# Altium footprint library SparkFun-Connectors.PCBLIB: 409 footprints (part 8 of 26)
Each footprint in its own frame and in the unit in brackets; x right, y up, seen from the top. Pads: shape width x height; smd on the part's side, far side on the other; paste and mask are expansions set on the pad; w line width, h text height; cw(c..) or ccw(c..) is an arc to the next point about the centre after c.
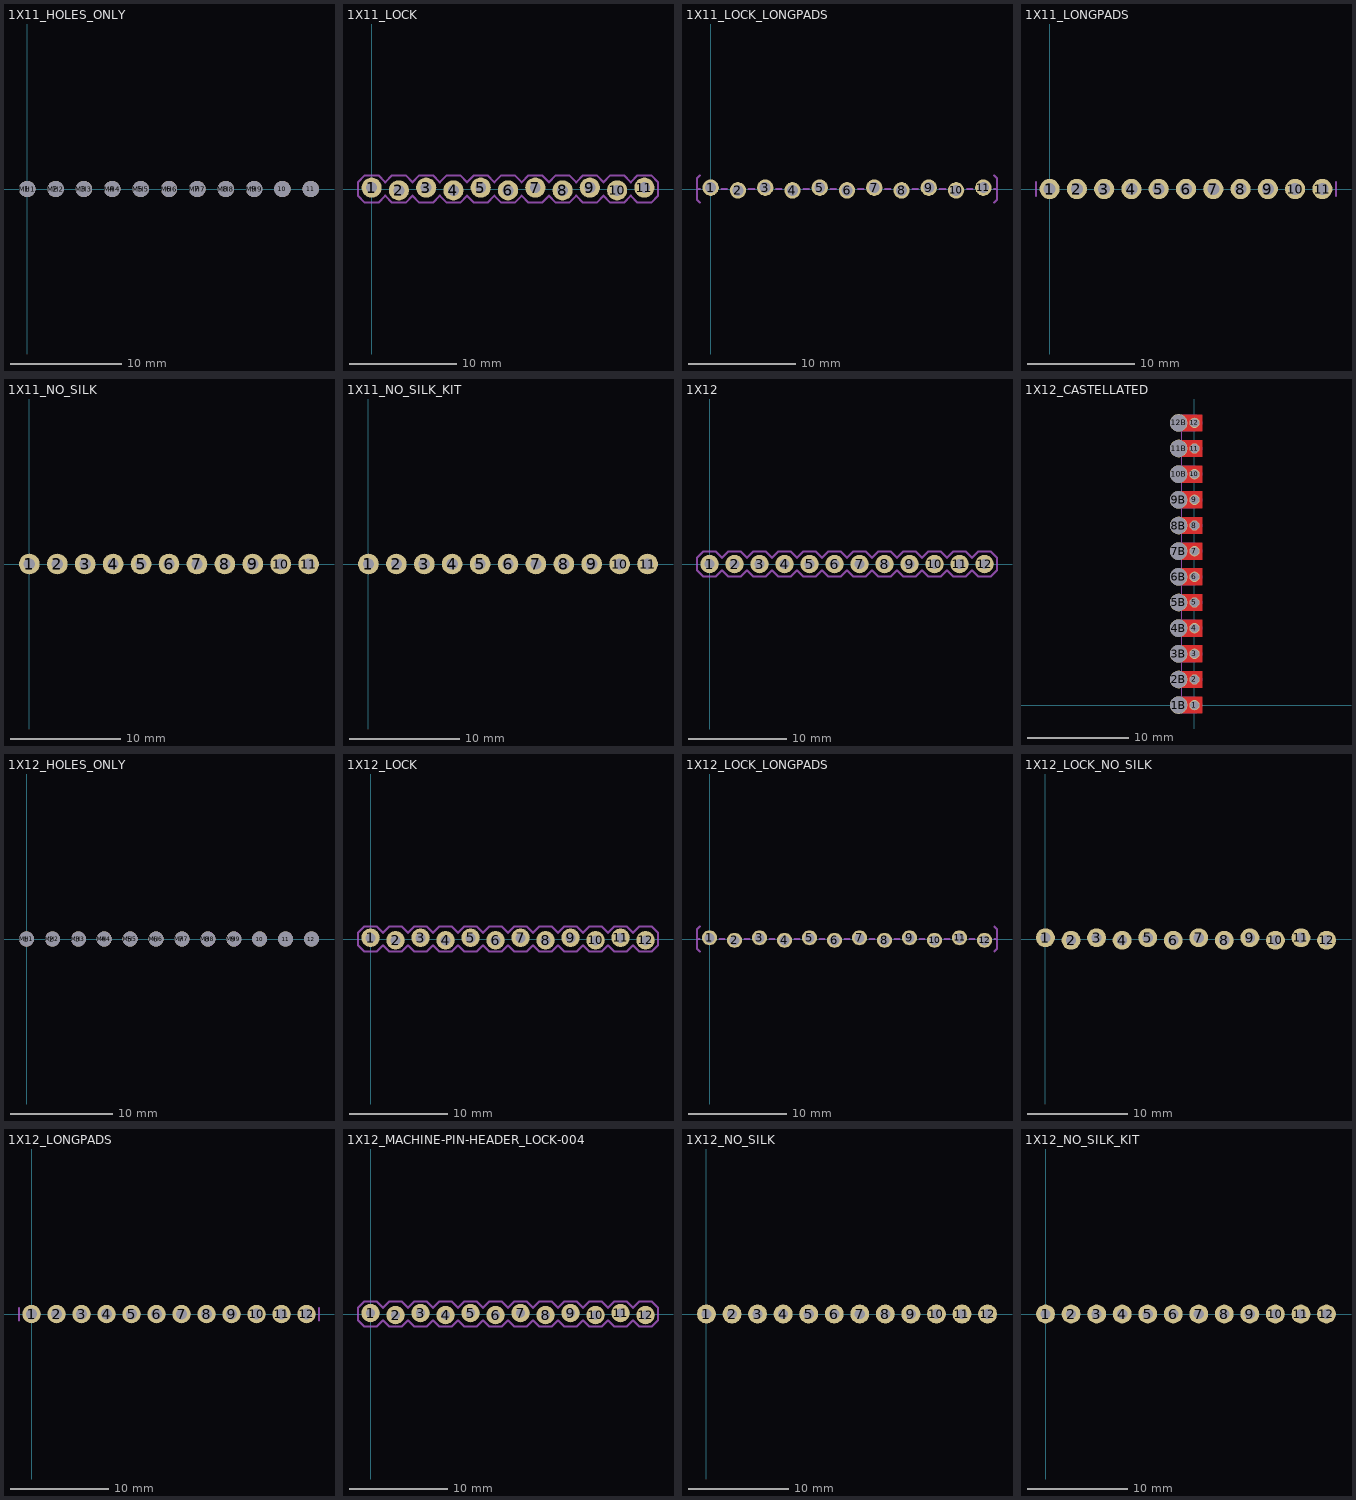
[diagram p7: the footprints below, top view; thin cyan lines are the x and y axes]

## 1X11_HOLES_ONLY [mil]
pads (22):
  round 35 hole 35: 1(0,0) 2(100,0) 3(200,0) 4(300,0) 5(400,0) 6(500,0) 7(600,0) 8(700,0) 9(800,0) 10(900,0) 11(1000,0)
  round 58 hole 58 unplated: MH1(0,0) MH2(100,0) MH3(200,0) MH4(300,0) MH5(400,0) MH6(500,0) MH7(600,0) MH8(700,0) MH9(800,0) MH10(900,0) MH11(1000,0)
tDocu:
  circle w5: c0,0 r25
  circle w5: c100,0 r25
  circle w5: c200,0 r25
  circle w5: c300,0 r25
  circle w5: c400,0 r25
  circle w5: c500,0 r25
  circle w5: c600,0 r25
  circle w5: c700,0 r25
  circle w5: c800,0 r25
  circle w5: c900,0 r25
  circle w5: c1000,0 r25

## 1X11_LOCK [mil]
pads (11):
  round 74 hole 40: 1(0,5) 2(100,-5) 3(200,5) 4(300,-5) 5(400,5) 6(500,-5) 7(600,5) 8(700,-5) 9(800,5) 10(900,-5) 11(1000,5)
tDocu:
  region: 590,-10 590,10 610,10 610,-10
  region: 490,-10 490,10 510,10 510,-10
  region: 390,-10 390,10 410,10 410,-10
  region: 290,-10 290,10 310,10 310,-10
  region: 190,-10 190,10 210,10 210,-10
  region: 90,-10 90,10 110,10 110,-10
  region: -10,-10 -10,10 10,10 10,-10
  region: 690,-10 690,10 710,10 710,-10
  region: 790,-10 790,10 810,10 810,-10
  region: 890,-10 890,10 910,10 910,-10
  region: 990,-10 990,10 1010,10 1010,-10
tPlace:
  lines w8: -50,-25 -50,25 -25,50 25,50 50,25 75,50 125,50 150,25 175,50 225,50 250,25 275,50 325,50 350,25 375,50 425,50 450,25 475,50 525,50 550,25 575,50 625,50 650,25 675,50 725,50 750,25 775,50 825,50 850,25 875,50 925,50 950,25 975,50 1025,50 1050,25 1050,-25 1025,-50 975,-50 950,-25 925,-50 875,-50 850,-25 825,-50 775,-50 750,-25 725,-50 675,-50 650,-25 625,-50 575,-50 550,-25 525,-50 475,-50 450,-25 425,-50 375,-50 350,-25 325,-50 275,-50 250,-25 225,-50 175,-50 150,-25 125,-50 75,-50 50,-25 25,-50 -25,-50 -50,-25

## 1X11_LOCK_LONGPADS [mil]
pads (11):
  round 60 hole 40: 1(0,5) 2(100,-5) 3(200,5) 4(300,-5) 5(400,5) 6(500,-5) 7(600,5) 8(700,-5) 9(800,5) 10(900,-5) 11(1000,5)
tDocu:
  region: -11.5,-11.5 -11.5,11.5 11.5,11.5 11.5,-11.5
  region: 88.5,-11.5 88.5,11.5 111.5,11.5 111.5,-11.5
  region: 188.5,-11.5 188.5,11.5 211.5,11.5 211.5,-11.5
  region: 311.5,-11.5 288.5,-11.5 288.5,11.5 311.5,11.5
  region: 388.5,-11.5 388.5,11.5 411.5,11.5 411.5,-11.5
  region: 488.5,-11.5 488.5,11.5 511.5,11.5 511.5,-11.5
  region: 588.5,-11.5 588.5,11.5 611.5,11.5 611.5,-11.5
  region: 688.5,-11.5 688.5,11.5 711.5,11.5 711.5,-11.5
  region: 788.5,-11.5 788.5,11.5 811.5,11.5 811.5,-11.5
  region: 911.5,-11.5 888.5,-11.5 888.5,11.5 911.5,11.5
  region: 988.5,-11.5 988.5,11.5 1011.5,11.5 1011.5,-11.5
tPlace:
  lines w8: -40,0 -50,0 ; -39,-50 -50,-39 -50,0 ; -39,50 -50,39 -50,0 ; 40,0 60,0 ; 140,0 160,0 ; 240,0 260,0 ; 340,0 360,0 ; 440,0 460,0 ; 540,0 560,0 ; 640,0 660,0 ; 740,0 760,0 ; 840,0 860,0 ; 940,0 960,0 ; 1039,-50 1050,-39 1050,0 ; 1039,50 1050,39 1050,0 ; 1040,0 1050,0

## 1X11_LONGPADS [mil]
pads (11):
  round 74 hole 44: 1(0,0) 2(100,0) 3(200,0) 4(300,0) 5(400,0) 6(500,0) 7(600,0) 8(700,0) 9(800,0) 10(900,0) 11(1000,0)
tDocu:
  region: 590,-10 590,10 610,10 610,-10
  region: 490,-10 490,10 510,10 510,-10
  region: 390,-10 390,10 410,10 410,-10
  region: 290,-10 290,10 310,10 310,-10
  region: 190,-10 190,10 210,10 210,-10
  region: 90,-10 90,10 110,10 110,-10
  region: -10,-10 -10,10 10,10 10,-10
  region: 690,-10 690,10 710,10 710,-10
  region: 790,-10 790,10 810,10 810,-10
  region: 890,-10 890,10 910,10 910,-10
  region: 990,-10 990,10 1010,10 1010,-10
tPlace:
  lines w8: -50,-25 -50,25 ; 1050,-25 1050,25

## 1X11_NO_SILK [mil]
pads (11):
  round 74 hole 40: 1(0,0) 2(100,0) 3(200,0) 4(300,0) 5(400,0) 6(500,0) 7(600,0) 8(700,0) 9(800,0) 10(900,0) 11(1000,0)
tDocu:
  region: 590,-10 590,10 610,10 610,-10
  region: 490,-10 490,10 510,10 510,-10
  region: 390,-10 390,10 410,10 410,-10
  region: 290,-10 290,10 310,10 310,-10
  region: 190,-10 190,10 210,10 210,-10
  region: 90,-10 90,10 110,10 110,-10
  region: -10,-10 -10,10 10,10 10,-10
  region: 690,-10 690,10 710,10 710,-10
  region: 790,-10 790,10 810,10 810,-10
  region: 890,-10 890,10 910,10 910,-10
  region: 990,-10 990,10 1010,10 1010,-10

## 1X11_NO_SILK_KIT [mil]
pads (11):
  round 74 hole 40: 1(0,0) 2(100,0) 3(200,0) 4(300,0) 5(400,0) 6(500,0) 7(600,0) 8(700,0) 9(800,0) 10(900,0) 11(1000,0)
Top Solder:
  circle w0: c0,0 r20
  circle w0: c100,0 r20
  circle w0: c200,0 r20
  circle w0: c300,0 r20
  circle w0: c400,0 r20
  circle w0: c500,0 r20
  circle w0: c600,0 r20
  circle w0: c700,0 r20
  circle w0: c800,0 r20
  circle w0: c900,0 r20
  circle w0: c1000,0 r20
Bottom Solder:
  circle w0: c0,0 r37.5
  circle w0: c100,0 r37.5
  circle w0: c200,0 r37.5
  circle w0: c300,0 r37.5
  circle w0: c400,0 r37.5
  circle w0: c500,0 r37.5
  circle w0: c600,0 r37.5
  circle w0: c700,0 r37.5
  circle w0: c800,0 r37.5
  circle w0: c900,0 r37.5
  circle w0: c1000,0 r37.5

## 1X12 [mil]
pads (12):
  round 74 hole 40: 1(0,0) 2(100,0) 3(200,0) 4(300,0) 5(400,0) 6(500,0) 7(600,0) 8(700,0) 9(800,0) 10(900,0) 11(1000,0) 12(1100,0)
tDocu:
  region: 590,-10 590,10 610,10 610,-10
  region: 490,-10 490,10 510,10 510,-10
  region: 390,-10 390,10 410,10 410,-10
  region: 290,-10 290,10 310,10 310,-10
  region: 190,-10 190,10 210,10 210,-10
  region: 90,-10 90,10 110,10 110,-10
  region: -10,-10 -10,10 10,10 10,-10
  region: 690,-10 690,10 710,10 710,-10
  region: 790,-10 790,10 810,10 810,-10
  region: 890,-10 890,10 910,10 910,-10
  region: 990,-10 990,10 1010,10 1010,-10
  region: 1090,-10 1090,10 1110,10 1110,-10
tPlace:
  lines w8: -50,-25 -50,25 -25,50 25,50 50,25 75,50 125,50 150,25 175,50 225,50 250,25 275,50 325,50 350,25 375,50 425,50 450,25 475,50 525,50 550,25 575,50 625,50 650,25 675,50 725,50 750,25 775,50 825,50 850,25 875,50 925,50 950,25 975,50 1025,50 1050,25 1075,50 1125,50 1150,25 1150,-25 1125,-50 1075,-50 1050,-25 1025,-50 975,-50 950,-25 925,-50 875,-50 850,-25 825,-50 775,-50 750,-25 725,-50 675,-50 650,-25 625,-50 575,-50 550,-25 525,-50 475,-50 450,-25 425,-50 375,-50 350,-25 325,-50 275,-50 250,-25 225,-50 175,-50 150,-25 125,-50 75,-50 50,-25 25,-50 -25,-50 -50,-25

## 1X12_CASTELLATED [mil]
pads (24):
  round 40 hole 33.46: 1(0,0) 2(0,100) 3(0,200) 4(0,300) 5(0,400) 6(0,500) 7(0,600) 8(0,700) 9(0,800) 10(0,900) 11(0,1000) 12(0,1100)
  round 68.9 hole 66.93: 1B(-61.81,0) 2B(-61.81,100) 3B(-61.81,200) 4B(-61.81,300) 5B(-61.81,400) 6B(-61.81,500) 7B(-61.81,600) 8B(-61.81,700) 9B(-61.81,800) 10B(-61.81,900) 11B(-61.81,1000) 12B(-61.81,1100)
Top:
  region: -50,632.5 30,632.5 30,600 30,567.5 -50,567.5
  region: -50,732.5 30,732.5 30,700 30,667.5 -50,667.5
  region: -50,532.5 30,532.5 30,500 30,467.5 -50,467.5
  region: -50,932.5 30,932.5 30,900 30,867.5 -50,867.5
  region: -50,1032.5 30,1032.5 30,1000 30,967.5 -50,967.5
  region: -50,832.5 30,832.5 30,800 30,767.5 -50,767.5
  region: -50,1132.5 30,1132.5 30,1100 30,1067.5 -50,1067.5
  region: -50,432.5 30,432.5 30,400 30,367.5 -50,367.5
  region: -50,232.5 30,232.5 30,200 30,167.5 -50,167.5
  region: -50,332.5 30,332.5 30,300 30,267.5 -50,267.5
  region: -50,132.5 30,132.5 30,100 30,67.5 -50,67.5
  region: -50,32.5 30,32.5 30,0 30,-32.5 -50,-32.5
Bottom:
  region: -50,567.5 0,567.5 3.05,567.7 8.98,569.24 14.5,571.87 19.42,575.5 23.58,580 26.8,585.2 28.98,590.91 30.05,596.94 30,600 29.96,603.04 28.79,609 26.54,614.64 23.31,619.78 19.19,624.25 14.32,627.88 8.87,630.57 3.02,632.22 0,632.5 -50,632.5
  region: -50,667.5 0,667.5 3.05,667.7 8.98,669.24 14.5,671.87 19.42,675.5 23.58,680 26.8,685.2 28.98,690.91 30.05,696.94 30,700 29.96,703.04 28.79,709 26.54,714.64 23.31,719.78 19.19,724.25 14.32,727.88 8.87,730.57 3.02,732.22 0,732.5 -50,732.5
  region: -50,467.5 0,467.5 3.05,467.7 8.98,469.24 14.5,471.87 19.42,475.5 23.58,480 26.8,485.2 28.98,490.91 30.05,496.94 30,500 29.96,503.04 28.79,509 26.54,514.64 23.31,519.78 19.19,524.25 14.32,527.88 8.87,530.57 3.02,532.22 0,532.5 -50,532.5
  region: -50,867.5 0,867.5 3.05,867.7 8.98,869.24 14.5,871.87 19.42,875.5 23.58,880 26.8,885.2 28.98,890.91 30.05,896.94 30,900 29.96,903.04 28.79,909 26.54,914.64 23.31,919.78 19.19,924.25 14.32,927.88 8.87,930.57 3.02,932.22 0,932.5 -50,932.5
  region: -50,967.5 0,967.5 3.05,967.7 8.98,969.24 14.5,971.87 19.42,975.5 23.58,980 26.8,985.2 28.98,990.91 30.05,996.94 30,1000 29.96,1003.04 28.79,1009 26.54,1014.64 23.31,1019.78 19.19,1024.25 14.32,1027.88 8.87,1030.57 3.02,1032.22 0,1032.5 -50,1032.5
  region: -50,767.5 0,767.5 3.05,767.7 8.98,769.24 14.5,771.87 19.42,775.5 23.58,780 26.8,785.2 28.98,790.91 30.05,796.94 30,800 29.96,803.04 28.79,809 26.54,814.64 23.31,819.78 19.19,824.25 14.32,827.88 8.87,830.57 3.02,832.22 0,832.5 -50,832.5
  region: -50,1067.5 0,1067.5 3.05,1067.7 8.98,1069.24 14.5,1071.87 19.42,1075.5 23.58,1080 26.8,1085.2 28.98,1090.91 30.05,1096.94 30,1100 29.96,1103.04 28.79,1109 26.54,1114.64 23.31,1119.78 19.19,1124.25 14.32,1127.88 8.87,1130.57 3.02,1132.22 0,1132.5 -50,1132.5
  region: -50,367.5 0,367.5 3.05,367.7 8.98,369.24 14.5,371.87 19.42,375.5 23.58,380 26.8,385.2 28.98,390.91 30.05,396.94 30,400 29.96,403.04 28.79,409 26.54,414.64 23.31,419.78 19.19,424.25 14.32,427.88 8.87,430.57 3.02,432.22 0,432.5 -50,432.5
  region: -50,167.5 0,167.5 3.05,167.7 8.98,169.24 14.5,171.87 19.42,175.5 23.58,180 26.8,185.2 28.98,190.91 30.05,196.94 30,200 29.96,203.04 28.79,209 26.54,214.64 23.31,219.78 19.19,224.25 14.32,227.88 8.87,230.57 3.02,232.22 0,232.5 -50,232.5
  region: -50,267.5 0,267.5 3.05,267.7 8.98,269.24 14.5,271.87 19.42,275.5 23.58,280 26.8,285.2 28.98,290.91 30.05,296.94 30,300 29.96,303.04 28.79,309 26.54,314.64 23.31,319.78 19.19,324.25 14.32,327.88 8.87,330.57 3.02,332.22 0,332.5 -50,332.5
  region: -50,67.5 0,67.5 3.05,67.7 8.98,69.24 14.5,71.87 19.42,75.5 23.58,80 26.8,85.2 28.98,90.91 30.05,96.94 30,100 29.96,103.04 28.79,109 26.54,114.64 23.31,119.78 19.19,124.25 14.32,127.88 8.87,130.57 3.02,132.22 0,132.5 -50,132.5
  region: -50,-32.5 0,-32.5 3.05,-32.3 8.98,-30.76 14.5,-28.13 19.42,-24.5 23.58,-20 26.8,-14.8 28.98,-9.09 30.05,-3.06 30,0 29.96,3.04 28.79,9 26.54,14.64 23.31,19.78 19.19,24.25 14.32,27.88 8.87,30.57 3.02,32.22 0,32.5 -50,32.5
Top Solder:
  region: -50,632.5 30,632.5 30,600 30,567.5 -50,567.5
  region: -50,732.5 30,732.5 30,700 30,667.5 -50,667.5
  region: -50,532.5 30,532.5 30,500 30,467.5 -50,467.5
  region: -50,932.5 30,932.5 30,900 30,867.5 -50,867.5
  region: -50,1032.5 30,1032.5 30,1000 30,967.5 -50,967.5
  region: -50,832.5 30,832.5 30,800 30,767.5 -50,767.5
  region: -50,1132.5 30,1132.5 30,1100 30,1067.5 -50,1067.5
  region: -50,432.5 30,432.5 30,400 30,367.5 -50,367.5
  region: -50,232.5 30,232.5 30,200 30,167.5 -50,167.5
  region: -50,332.5 30,332.5 30,300 30,267.5 -50,267.5
  region: -50,132.5 30,132.5 30,100 30,67.5 -50,67.5
  region: -50,32.5 30,32.5 30,0 30,-32.5 -50,-32.5
Bottom Solder:
  drawing of 12 lines, arcs and shapes, not listed
tDocu:
  region: 10,690 -10,690 -10,710 10,710
  region: 10,590 -10,590 -10,610 10,610
  region: 10,490 -10,490 -10,510 10,510
  region: 10,990 -10,990 -10,1010 10,1010
  region: 10,890 -10,890 -10,910 10,910
  region: 10,790 -10,790 -10,810 10,810
  region: 10,1090 -10,1090 -10,1110 10,1110
  region: 10,390 -10,390 -10,410 10,410
  region: 10,290 -10,290 -10,310 10,310
  region: 10,190 -10,190 -10,210 10,210
  region: 10,90 -10,90 -10,110 10,110
  region: 10,-10 -10,-10 -10,10 10,10
  lines w1: -50,0 -50,1100

## 1X12_HOLES_ONLY [mil]
pads (24):
  round 35 hole 35: 1(0,0) 2(100,0) 3(200,0) 4(300,0) 5(400,0) 6(500,0) 7(600,0) 8(700,0) 9(800,0) 10(900,0) 11(1000,0) 12(1100,0)
  round 58 hole 58 unplated: MH1(0,0) MH2(100,0) MH3(200,0) MH4(300,0) MH5(400,0) MH6(500,0) MH7(600,0) MH8(700,0) MH9(800,0) MH10(900,0) MH11(1000,0) MH12(1100,0)
tDocu:
  circle w5: c0,0 r25
  circle w5: c100,0 r25
  circle w5: c200,0 r25
  circle w5: c300,0 r25
  circle w5: c400,0 r25
  circle w5: c500,0 r25
  circle w5: c600,0 r25
  circle w5: c700,0 r25
  circle w5: c800,0 r25
  circle w5: c900,0 r25
  circle w5: c1000,0 r25
  circle w5: c1100,0 r25

## 1X12_LOCK [mil]
pads (12):
  round 74 hole 40: 1(0,5) 2(100,-5) 3(200,5) 4(300,-5) 5(400,5) 6(500,-5) 7(600,5) 8(700,-5) 9(800,5) 10(900,-5) 11(1000,5) 12(1100,-5)
tDocu:
  region: 590,-10 590,10 610,10 610,-10
  region: 510,-10 490,-10 490,10 510,10
  region: 390,-10 390,10 410,10 410,-10
  region: 290,-10 290,10 310,10 310,-10
  region: 190,-10 190,10 210,10 210,-10
  region: 90,-10 90,10 110,10 110,-10
  region: -10,-10 -10,10 10,10 10,-10
  region: 690,-10 690,10 710,10 710,-10
  region: 790,-10 790,10 810,10 810,-10
  region: 890,-10 890,10 910,10 910,-10
  region: 990,-10 990,10 1010,10 1010,-10
  region: 1090,-10 1090,10 1110,10 1110,-10
tPlace:
  lines w8: -50,-25 -50,25 -25,50 25,50 50,25 75,50 125,50 150,25 175,50 225,50 250,25 275,50 325,50 350,25 375,50 425,50 450,25 475,50 525,50 550,25 575,50 625,50 650,25 675,50 725,50 750,25 775,50 825,50 850,25 875,50 925,50 950,25 975,50 1025,50 1050,25 1075,50 1125,50 1150,25 1150,-25 1125,-50 1075,-50 1050,-25 1025,-50 975,-50 950,-25 925,-50 875,-50 850,-25 825,-50 775,-50 750,-25 725,-50 675,-50 650,-25 625,-50 575,-50 550,-25 525,-50 475,-50 450,-25 425,-50 375,-50 350,-25 325,-50 275,-50 250,-25 225,-50 175,-50 150,-25 125,-50 75,-50 50,-25 25,-50 -25,-50 -50,-25

## 1X12_LOCK_LONGPADS [mil]
pads (12):
  round 60 hole 40: 1(0,5) 2(100,-5) 3(200,5) 4(300,-5) 5(400,5) 6(500,-5) 7(600,5) 8(700,-5) 9(800,5) 10(900,-5) 11(1000,5) 12(1100,-5)
tDocu:
  region: -11.5,-11.5 -11.5,11.5 11.5,11.5 11.5,-11.5
  region: 88.5,-11.5 88.5,11.5 111.5,11.5 111.5,-11.5
  region: 188.5,-11.5 188.5,11.5 211.5,11.5 211.5,-11.5
  region: 311.5,-11.5 288.5,-11.5 288.5,11.5 311.5,11.5
  region: 388.5,-11.5 388.5,11.5 411.5,11.5 411.5,-11.5
  region: 488.5,-11.5 488.5,11.5 511.5,11.5 511.5,-11.5
  region: 588.5,-11.5 588.5,11.5 611.5,11.5 611.5,-11.5
  region: 688.5,-11.5 688.5,11.5 711.5,11.5 711.5,-11.5
  region: 788.5,-11.5 788.5,11.5 811.5,11.5 811.5,-11.5
  region: 911.5,-11.5 888.5,-11.5 888.5,11.5 911.5,11.5
  region: 988.5,-11.5 988.5,11.5 1011.5,11.5 1011.5,-11.5
  region: 1088.5,-11.5 1088.5,11.5 1111.5,11.5 1111.5,-11.5
tPlace:
  lines w8: -40,0 -50,0 ; -39,-50 -50,-39 -50,0 ; -39,50 -50,39 -50,0 ; 40,0 60,0 ; 140,0 160,0 ; 240,0 260,0 ; 340,0 360,0 ; 440,0 460,0 ; 540,0 560,0 ; 640,0 660,0 ; 740,0 760,0 ; 840,0 860,0 ; 940,0 960,0 ; 1040,0 1060,0 ; 1139,-50 1150,-39 1150,0 ; 1139,50 1150,39 1150,0 ; 1140,0 1150,0

## 1X12_LOCK_NO_SILK [mil]
pads (12):
  round 74 hole 40: 1(0,5) 2(100,-5) 3(200,5) 4(300,-5) 5(400,5) 6(500,-5) 7(600,5) 8(700,-5) 9(800,5) 10(900,-5) 11(1000,5) 12(1100,-5)
tDocu:
  region: 590,-10 590,10 610,10 610,-10
  region: 490,-10 490,10 510,10 510,-10
  region: 390,-10 390,10 410,10 410,-10
  region: 290,-10 290,10 310,10 310,-10
  region: 190,-10 190,10 210,10 210,-10
  region: 90,-10 90,10 110,10 110,-10
  region: -10,-10 -10,10 10,10 10,-10
  region: 1090,-10 1090,10 1110,10 1110,-10
  region: 990,-10 990,10 1010,10 1010,-10
  region: 890,-10 890,10 910,10 910,-10
  region: 790,-10 790,10 810,10 810,-10
  region: 690,-10 690,10 710,10 710,-10

## 1X12_LONGPADS [mil]
pads (12):
  round 74 hole 44: 1(0,0) 2(100,0) 3(200,0) 4(300,0) 5(400,0) 6(500,0) 7(600,0) 8(700,0) 9(800,0) 10(900,0) 11(1000,0) 12(1100,0)
tDocu:
  region: 590,-10 590,10 610,10 610,-10
  region: 490,-10 490,10 510,10 510,-10
  region: 390,-10 390,10 410,10 410,-10
  region: 290,-10 290,10 310,10 310,-10
  region: 190,-10 190,10 210,10 210,-10
  region: 90,-10 90,10 110,10 110,-10
  region: -10,-10 -10,10 10,10 10,-10
  region: 690,-10 690,10 710,10 710,-10
  region: 790,-10 790,10 810,10 810,-10
  region: 890,-10 890,10 910,10 910,-10
  region: 990,-10 990,10 1010,10 1010,-10
  region: 1090,-10 1090,10 1110,10 1110,-10
tPlace:
  lines w8: -50,-25 -50,25 ; 1150,-25 1150,25

## 1X12_MACHINE-PIN-HEADER_LOCK-004 [mil]
pads (12):
  round 74 hole 35: 1(0,4) 2(100,-4) 3(200,4) 4(300,-4) 5(400,4) 6(500,-4) 7(600,4) 8(700,-4) 9(800,4) 10(900,-4) 11(1000,4) 12(1100,-4)
tDocu:
  circle w1: c0,0 r13
  circle w1: c100,0 r13
  circle w1: c200,0 r13
  circle w1: c300,0 r13
  circle w1: c400,0 r13
  circle w1: c500,0 r13
  circle w1: c600,0 r13
  circle w1: c700,0 r13
  circle w1: c800,0 r13
  circle w1: c900,0 r13
  circle w1: c1000,0 r13
  circle w1: c1100,0 r13
tPlace:
  lines w8: -50,-25 -50,25 -25,50 25,50 50,25 75,50 125,50 150,25 175,50 225,50 250,25 275,50 325,50 350,25 375,50 425,50 450,25 475,50 525,50 550,25 575,50 625,50 650,25 675,50 725,50 750,25 775,50 825,50 850,25 875,50 925,50 950,25 975,50 1025,50 1050,25 1075,50 1125,50 1150,25 1150,-25 1125,-50 1075,-50 1050,-25 1025,-50 975,-50 950,-25 925,-50 875,-50 850,-25 825,-50 775,-50 750,-25 725,-50 675,-50 650,-25 625,-50 575,-50 550,-25 525,-50 475,-50 450,-25 425,-50 375,-50 350,-25 325,-50 275,-50 250,-25 225,-50 175,-50 150,-25 125,-50 75,-50 50,-25 25,-50 -25,-50 -50,-25

## 1X12_NO_SILK [mil]
pads (12):
  round 74 hole 40: 1(0,0) 2(100,0) 3(200,0) 4(300,0) 5(400,0) 6(500,0) 7(600,0) 8(700,0) 9(800,0) 10(900,0) 11(1000,0) 12(1100,0)

## 1X12_NO_SILK_KIT [mil]
pads (12):
  round 74 hole 40: 1(0,0) 2(100,0) 3(200,0) 4(300,0) 5(400,0) 6(500,0) 7(600,0) 8(700,0) 9(800,0) 10(900,0) 11(1000,0) 12(1100,0)
Top Solder:
  circle w0: c0,0 r20
  circle w0: c100,0 r20
  circle w0: c200,0 r20
  circle w0: c300,0 r20
  circle w0: c400,0 r20
  circle w0: c500,0 r20
  circle w0: c600,0 r20
  circle w0: c700,0 r20
  circle w0: c800,0 r20
  circle w0: c900,0 r20
  circle w0: c1000,0 r20
  circle w0: c1100,0 r20
Bottom Solder:
  circle w0: c0,0 r37.5
  circle w0: c100,0 r37.5
  circle w0: c200,0 r37.5
  circle w0: c300,0 r37.5
  circle w0: c400,0 r37.5
  circle w0: c500,0 r37.5
  circle w0: c600,0 r37.5
  circle w0: c700,0 r37.5
  circle w0: c800,0 r37.5
  circle w0: c900,0 r37.5
  circle w0: c1000,0 r37.5
  circle w0: c1100,0 r37.5